# Altium footprint library AltiumLibraries.PcbLib: 247 footprints (part 11 of 16)
Each footprint in its own frame and in the unit in brackets; x right, y up, seen from the top. Pads: shape width x height; smd on the part's side, far side on the other; paste and mask are expansions set on the pad; w line width, h text height; cw(c..) or ccw(c..) is an arc to the next point about the centre after c.
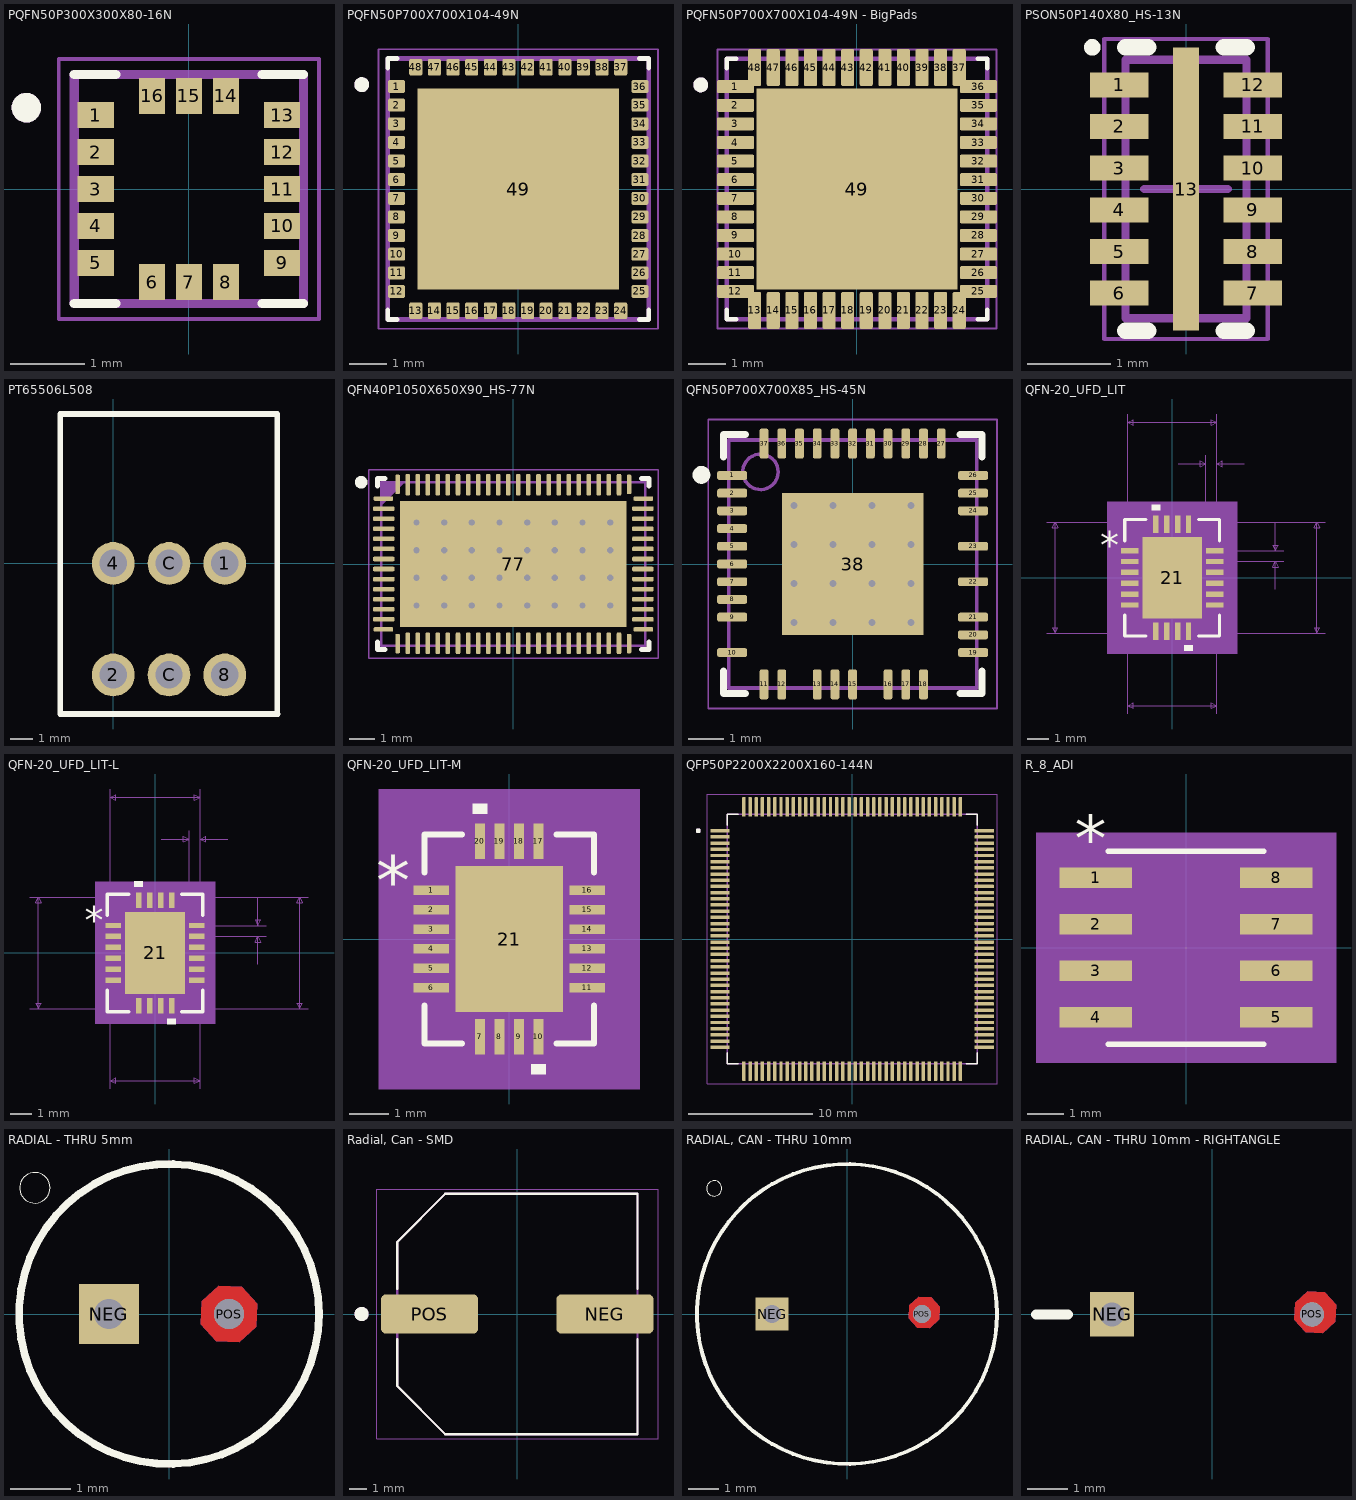
[diagram p10: the footprints below, top view; thin cyan lines are the x and y axes]

## PQFN50P300X300X80-16N [mm]
pads (16):
  rect 0.49x0.35 smd: 1(-1.26,1) 2(-1.26,0.5) 3(-1.26,0) 4(-1.26,-0.5) 5(-1.26,-1) 9(1.26,-1) 10(1.26,-0.5) 11(1.26,0) 12(1.26,0.5) 13(1.26,1)
  rect 0.35x0.49 smd: 6(-0.5,-1.26) 7(0,-1.26) 8(0.5,-1.26) 14(0.5,1.26) 15(0,1.26) 16(-0.5,1.26)
Top Overlay:
  circle w0.2: c-2.2,1.1 r0.1
  lines w0.127: -1.55,-1.55 -0.99,-1.55 ; -1.55,1.55 -0.99,1.55 ; 0.99,-1.55 1.55,-1.55 ; 0.99,1.55 1.55,1.55
Mechanical 13:
  circle w0.2: c-2.2,1.1 r0.1
  lines w0.127: -1.55,-1.55 1.55,-1.55 1.55,1.55 -1.55,1.55 -1.55,-1.55
Mechanical 15:
  lines w0.05: -1.76,-1.76 1.76,-1.76 1.76,1.76 -1.76,1.76 -1.76,-1.76
3D body "step_temp.STEP": height 0.8, standoff 0, extent -1.5,-1.5 1.5,1.5

## PQFN50P700X700X104-49N [mm]
pads (49):
  rrect25% 0.45x0.35 smd: 1(-3.265,2.75) 2(-3.265,2.25) 3(-3.265,1.75) 4(-3.265,1.25) 5(-3.265,0.75) 6(-3.265,0.25) 7(-3.265,-0.25) 8(-3.265,-0.75) 9(-3.265,-1.25) 10(-3.265,-1.75) 11(-3.265,-2.25) 12(-3.265,-2.75) 25(3.265,-2.75) 26(3.265,-2.25) 27(3.265,-1.75) 28(3.265,-1.25) 29(3.265,-0.75) 30(3.265,-0.25) 31(3.265,0.25) 32(3.265,0.75) 33(3.265,1.25) 34(3.265,1.75) 35(3.265,2.25) 36(3.265,2.75)
  rrect25% 0.35x0.45 smd: 13(-2.75,-3.265) 14(-2.25,-3.265) 15(-1.75,-3.265) 16(-1.25,-3.265) 17(-0.75,-3.265) 18(-0.25,-3.265) 19(0.25,-3.265) 20(0.75,-3.265) 21(1.25,-3.265) 22(1.75,-3.265) 23(2.25,-3.265) 24(2.75,-3.265) 37(2.75,3.265) 38(2.25,3.265) 39(1.75,3.265) 40(1.25,3.265) 41(0.75,3.265) 42(0.25,3.265) 43(-0.25,3.265) 44(-0.75,3.265) 45(-1.25,3.265) 46(-1.75,3.265) 47(-2.25,3.265) 48(-2.75,3.265)
  rect 5.4x5.4 smd paste-4: 49(0,0)
Top Overlay:
  circle w0.2: c-4.2,2.8 r0.1
  lines w0.127: -3.5,-3.245 -3.5,-3.5 -3.245,-3.5 ; -3.5,3.245 -3.5,3.5 -3.245,3.5 ; 3.245,-3.5 3.5,-3.5 3.5,-3.245 ; 3.245,3.5 3.5,3.5 3.5,3.245
Top Paste:
  region: 2.305,-2.305 0.395,-2.305 0.395,-0.395 2.305,-0.395
  region: -0.395,-2.305 -2.305,-2.305 -2.305,-0.395 -0.395,-0.395
  region: -0.395,0.395 -2.305,0.395 -2.305,2.305 -0.395,2.305
  region: 2.305,0.395 0.395,0.395 0.395,2.305 2.305,2.305
Mechanical 13:
  circle w0.2: c-4.2,2.8 r0.1
  lines w0.127: -3.5,-3.5 3.5,-3.5 3.5,3.5 -3.5,3.5 -3.5,-3.5
Mechanical 15:
  lines w0.05: -3.75,-3.75 -3.75,3.75 3.75,3.75 3.75,-3.75 -3.75,-3.75
3D body "step_temp.STEP": height 1.04, standoff 0, extent -3.5,-3.5 3.5,3.5

## PQFN50P700X700X104-49N - BigPads [mm]
pads (49):
  rrect25% 1x0.35 smd: 1(-3.265,2.75) 2(-3.265,2.25) 3(-3.265,1.75) 4(-3.265,1.25) 5(-3.265,0.75) 6(-3.265,0.25) 7(-3.265,-0.25) 8(-3.265,-0.75) 9(-3.265,-1.25) 10(-3.265,-1.75) 11(-3.265,-2.25) 12(-3.265,-2.75) 25(3.265,-2.75) 26(3.265,-2.25) 27(3.265,-1.75) 28(3.265,-1.25) 29(3.265,-0.75) 30(3.265,-0.25) 31(3.265,0.25) 32(3.265,0.75) 33(3.265,1.25) 34(3.265,1.75) 35(3.265,2.25) 36(3.265,2.75)
  rrect25% 0.35x1 smd: 13(-2.75,-3.265) 14(-2.25,-3.265) 15(-1.75,-3.265) 16(-1.25,-3.265) 17(-0.75,-3.265) 18(-0.25,-3.265) 19(0.25,-3.265) 20(0.75,-3.265) 21(1.25,-3.265) 22(1.75,-3.265) 23(2.25,-3.265) 24(2.75,-3.265) 37(2.75,3.265) 38(2.25,3.265) 39(1.75,3.265) 40(1.25,3.265) 41(0.75,3.265) 42(0.25,3.265) 43(-0.25,3.265) 44(-0.75,3.265) 45(-1.25,3.265) 46(-1.75,3.265) 47(-2.25,3.265) 48(-2.75,3.265)
  rect 5.4x5.4 smd paste-4: 49(0,0)
Top Overlay:
  circle w0.2: c-4.2,2.8 r0.1
  lines w0.127: -3.5,-3.245 -3.5,-3.5 -3.245,-3.5 ; -3.5,3.245 -3.5,3.5 -3.245,3.5 ; 3.245,-3.5 3.5,-3.5 3.5,-3.245 ; 3.245,3.5 3.5,3.5 3.5,3.245
Top Paste:
  region: 2.305,-2.305 0.395,-2.305 0.395,-0.395 2.305,-0.395
  region: -0.395,-2.305 -2.305,-2.305 -2.305,-0.395 -0.395,-0.395
  region: -0.395,0.395 -2.305,0.395 -2.305,2.305 -0.395,2.305
  region: 2.305,0.395 0.395,0.395 0.395,2.305 2.305,2.305
Mechanical 13:
  circle w0.2: c-4.2,2.8 r0.1
  lines w0.127: -3.5,-3.5 3.5,-3.5 3.5,3.5 -3.5,3.5 -3.5,-3.5
Mechanical 15:
  lines w0.05: -3.75,-3.75 -3.75,3.75 3.75,3.75 3.75,-3.75 -3.75,-3.75
3D body "step_temp.STEP": height 1.04, standoff 0, extent -3.5,-3.5 3.5,3.5

## PSON50P140X80_HS-13N [mm] "PSON, 12-Leads, Body 3.00x1.35mm, Pitch 0.50mm, Thermal Pad 3.05x0.31mm, IPC Medium Density"
height 0.8
pads (13):
  rect 0.7x0.3 smd: 1(-0.8,1.25) 2(-0.8,0.75) 3(-0.8,0.25) 4(-0.8,-0.25) 5(-0.8,-0.75) 6(-0.8,-1.25) 7(0.8,-1.25) 8(0.8,-0.75) 9(0.8,-0.25) 10(0.8,0.25) 11(0.8,0.75) 12(0.8,1.25)
  rect 0.31x3.4 smd: 13(0,0)
Top Overlay:
  circle w0.1: c-1.125,1.7 r0.05
  lines w0.2: -0.725,-1.7 -0.455,-1.7 ; -0.725,1.7 -0.455,1.7 ; 0.455,-1.7 0.725,-1.7 ; 0.455,1.7 0.725,1.7
Mechanical 13:
  lines w0.1: -0.725,-1.55 -0.725,1.55 0.725,1.55 0.725,-1.55 -0.725,-1.55
Mechanical 15:
  lines w0.05: -0.98,-1.8 -0.98,1.8 0.98,1.8 0.98,-1.8 -0.98,-1.8
  lines w0.1: -0.5,0 0.5,0 ; 0,-0.5 0,0.5
3D body: height 0.8, standoff 0, extent -0.725,-1.55 0.725,1.55

## PT65506L508 [mm] "Rotary Dip Switch Hexadecimal Complement 16 Position Through Hole, Right Angle Rotary with Knob Actuator 150mA 24VDC"
pads (6):
  round 1.95 hole 1.25: 1(5.08,0) 2(0,-5.08) 4(0,0) 8(5.08,-5.08) C(2.54,-5.08) C(2.54,0)
Top Overlay:
  lines w0.254: -2.413,-6.858 -2.413,6.807 7.468,6.807 7.468,-6.833 7.493,-6.858 -1.651,-6.858 -2.413,-6.858
3D body "PT65101L508--3DModel-STEP-56544.STEP": height 10, standoff -4, extent -2.482,-5.217 7.518,6.883

## QFN40P1050X650X90_HS-77N [mm] "QFN, 76-Leads, Body 10,50x6,50mm, Pitch 0,40mm, Thermal Pad 9,00x5,00mm, IPC Medium Density"
height 0.9
pads (77):
  rrect50% 0.768x0.182 smd mask+0.051: 1(-5.166,2.6) 14(-5.166,-2.6) 39(5.166,-2.6) 52(5.166,2.6)
  rrect50% 0.85x0.182 smd mask+0.051: 2(-5.15,2.2) 3(-5.15,1.8) 4(-5.15,1.4) 5(-5.15,1) 6(-5.15,0.6) 7(-5.15,0.2) 8(-5.15,-0.2) 9(-5.15,-0.6) 10(-5.15,-1) 11(-5.15,-1.4) 12(-5.15,-1.8) 13(-5.15,-2.2) 40(5.15,-2.2) 41(5.15,-1.8) 42(5.15,-1.4) 43(5.15,-1) 44(5.15,-0.6) 45(5.15,-0.2) 46(5.15,0.2) 47(5.15,0.6) 48(5.15,1) 49(5.15,1.4) 50(5.15,1.8) 51(5.15,2.2)
  rrect50% 0.182x0.768 smd mask+0.051: 15(-4.6,-3.166) 38(4.6,-3.166) 53(4.6,3.166) 76(-4.6,3.166)
  rrect50% 0.182x0.85 smd mask+0.051: 16(-4.2,-3.15) 17(-3.8,-3.15) 18(-3.4,-3.15) 19(-3,-3.15) 20(-2.6,-3.15) 21(-2.2,-3.15) 22(-1.8,-3.15) 23(-1.4,-3.15) 24(-1,-3.15) 25(-0.6,-3.15) 26(-0.2,-3.15) 27(0.2,-3.15) 28(0.6,-3.15) 29(1,-3.15) 30(1.4,-3.15) 31(1.8,-3.15) 32(2.2,-3.15) 33(2.6,-3.15) 34(3,-3.15) 35(3.4,-3.15) 36(3.8,-3.15) 37(4.2,-3.15) 54(4.2,3.15) 55(3.8,3.15) 56(3.4,3.15) 57(3,3.15) 58(2.6,3.15) 59(2.2,3.15) 60(1.8,3.15) 61(1.4,3.15) 62(1,3.15) 63(0.6,3.15) 64(0.2,3.15) 65(-0.2,3.15) 66(-0.6,3.15) 67(-1,3.15) 68(-1.4,3.15) 69(-1.8,3.15) 70(-2.2,3.15) 71(-2.6,3.15) 72(-3,3.15) 73(-3.4,3.15) 74(-3.8,3.15) 75(-4.2,3.15)
  rect 9x5 smd paste-99 mask+0.051: 77(0,0)
via 3.85,-1.65 diameter 0.61 hole 0.254
via 2.75,-1.65 diameter 0.61 hole 0.254
via 1.65,-1.65 diameter 0.61 hole 0.254
via 0.55,-1.65 diameter 0.61 hole 0.254
via -0.55,-1.65 diameter 0.61 hole 0.254
via -1.65,-1.65 diameter 0.61 hole 0.254
via -2.75,-1.65 diameter 0.61 hole 0.254
via -3.85,-1.65 diameter 0.61 hole 0.254
via 3.85,-0.55 diameter 0.61 hole 0.254
via 2.75,-0.55 diameter 0.61 hole 0.254
via 1.65,-0.55 diameter 0.61 hole 0.254
via 0.55,-0.55 diameter 0.61 hole 0.254
via -0.55,-0.55 diameter 0.61 hole 0.254
via -1.65,-0.55 diameter 0.61 hole 0.254
via -2.75,-0.55 diameter 0.61 hole 0.254
via -3.85,-0.55 diameter 0.61 hole 0.254
via 3.85,0.55 diameter 0.61 hole 0.254
via 2.75,0.55 diameter 0.61 hole 0.254
via 1.65,0.55 diameter 0.61 hole 0.254
via 0.55,0.55 diameter 0.61 hole 0.254
via -0.55,0.55 diameter 0.61 hole 0.254
via -1.65,0.55 diameter 0.61 hole 0.254
via -2.75,0.55 diameter 0.61 hole 0.254
via -3.85,0.55 diameter 0.61 hole 0.254
via 3.85,1.65 diameter 0.61 hole 0.254
via 2.75,1.65 diameter 0.61 hole 0.254
via 1.65,1.65 diameter 0.61 hole 0.254
via 0.55,1.65 diameter 0.61 hole 0.254
via -0.55,1.65 diameter 0.61 hole 0.254
via -1.65,1.65 diameter 0.61 hole 0.254
via -2.75,1.65 diameter 0.61 hole 0.254
via -3.85,1.65 diameter 0.61 hole 0.254
Top Overlay:
  circle w0.25: c-6.05,3.25 r0.125
  lines w0.2: -5.4,-3.1 -5.4,-3.4 -5.1,-3.4 ; -5.4,3.1 -5.4,3.4 -5.1,3.4 ; 5.1,-3.4 5.4,-3.4 5.4,-3.1 ; 5.1,3.4 5.4,3.4 5.4,3.1
Top Paste:
  circle w0.35: c-2.75,-0.55 r0.55
  circle w0.35: c-2.75,0.55 r0.55
  circle w0.35: c-2.75,1.65 r0.55
  circle w0.35: c-1.65,1.65 r0.55
  circle w0.35: c-1.65,0.55 r0.55
  circle w0.35: c-0.55,0.55 r0.55
  circle w0.35: c-1.65,-0.55 r0.55
  circle w0.35: c-0.55,-0.55 r0.55
  circle w0.35: c-2.75,-1.65 r0.55
  circle w0.35: c-1.65,-1.65 r0.55
  circle w0.35: c-0.55,-1.65 r0.55
  circle w0.35: c0.55,-1.65 r0.55
  circle w0.35: c1.65,0.55 r0.55
  circle w0.35: c0.55,0.55 r0.55
  circle w0.35: c0.55,-0.55 r0.55
  circle w0.35: c1.65,-0.55 r0.55
  circle w0.35: c1.65,-1.65 r0.55
  circle w0.35: c2.75,-1.65 r0.55
  circle w0.35: c2.75,-0.55 r0.55
  circle w0.35: c2.75,0.55 r0.55
  circle w0.35: c2.75,1.65 r0.55
  circle w0.35: c1.65,1.65 r0.55
  circle w0.35: c0.55,1.65 r0.55
  circle w0.35: c-0.55,1.65 r0.55
  rectangle: 4.282,-2.5 4.5,2.5
  region: -4.282,2.5 -4.5,2.5 -4.5,-2.5 -4.282,-2.5
  region: 4.5,-2.102 -4.5,-2.102 -4.5,-2.5 4.5,-2.5
  region: 4.5,2.102 -4.5,2.102 -4.5,2.5 4.5,2.5
  region: 4.5,-1.002 -4.5,-1.002 -4.5,-1.203 4.5,-1.203
  region: 4.5,0.098 -4.5,0.098 -4.5,-0.103 4.5,-0.103
  region: 4.5,1.198 -4.5,1.198 -4.5,0.997 4.5,0.997
  lines w0.254: -4.286,-1.395 ccw(c-3.85,-1.65) -4.282,-1.912 ; -4.286,-0.295 ccw(c-3.85,-0.55) -4.282,-0.812 ; -4.286,0.805 ccw(c-3.85,0.55) -4.282,0.288 ; -4.286,1.905 ccw(c-3.85,1.65) -4.282,1.388 ; 4.282,-1.388 cw(c3.85,-1.65) 4.286,-1.905 ; 4.282,-0.288 cw(c3.85,-0.55) 4.286,-0.805 ; 4.282,0.812 cw(c3.85,0.55) 4.286,0.295 ; 4.282,1.912 cw(c3.85,1.65) 4.286,1.395
  lines w0.35: -4.325,-1.372 cw(c-3.85,-1.65) -4.32,-1.935 ; -4.325,-0.272 cw(c-3.85,-0.55) -4.32,-0.835 ; -4.325,0.828 cw(c-3.85,0.55) -4.32,0.265 ; -4.325,1.928 cw(c-3.85,1.65) -4.32,1.365 ; 4.32,-1.365 ccw(c3.85,-1.65) 4.325,-1.928 ; 4.32,-0.265 ccw(c3.85,-0.55) 4.325,-0.828 ; 4.32,0.835 ccw(c3.85,0.55) 4.325,0.272 ; 4.32,1.935 ccw(c3.85,1.65) 4.325,1.372
Mechanical 15:
  lines w0.05: -5.75,-3.75 5.75,-3.75 5.75,3.75 -5.75,3.75 -5.75,-3.75
Mechanical 29:
  region: -5.25,3.25 -5.25,2.318 -4.318,3.25
  lines w0.1: -5.25,-3.25 -5.25,3.25 5.25,3.25 5.25,-3.25 -5.25,-3.25
3D body "QFN40P1050X650X90_HS-77N.step": height 0.9, standoff 0, extent -4.927,-3.251 5.575,3.251

## QFN50P700X700X85_HS-45N [mm] "QFN, 44-Leads, Body 7.00x7.00mm, Pitch 0.50mm, Thermal Pad 4.00x4.00mm, IPC Medium Density"
height 0.85
pads (38):
  rrect50% 0.85x0.25 smd mask+0.075: 1(-3.4,2.5) 2(-3.4,2) 3(-3.4,1.5) 4(-3.4,1) 5(-3.4,0.5) 6(-3.4,0) 7(-3.4,-0.5) 8(-3.4,-1) 9(-3.4,-1.5) 10(-3.4,-2.5) 19(3.4,-2.5) 20(3.4,-2) 21(3.4,-1.5) 22(3.4,-0.5) 23(3.4,0.5) 24(3.4,1.5) 25(3.4,2) 26(3.4,2.5)
  rrect50% 0.25x0.85 smd mask+0.075: 11(-2.5,-3.4) 12(-2,-3.4) 13(-1,-3.4) 14(-0.5,-3.4) 15(0,-3.4) 16(1,-3.4) 17(1.5,-3.4) 18(2,-3.4) 27(2.5,3.4) 28(2,3.4) 29(1.5,3.4) 30(1,3.4) 31(0.5,3.4) 32(0,3.4) 33(-0.5,3.4) 34(-1,3.4) 35(-1.5,3.4) 36(-2,3.4) 37(-2.5,3.4)
  rect 4x4 smd paste-99: 38(0,0)
via -0.55,1.65 diameter 0.5 hole 0.2
via 0.55,1.65 diameter 0.5 hole 0.2
via -1.65,0.55 diameter 0.5 hole 0.2
via -0.55,0.55 diameter 0.5 hole 0.2
via 0.55,0.55 diameter 0.5 hole 0.2
via 1.65,0.55 diameter 0.5 hole 0.2
via -1.65,-0.55 diameter 0.5 hole 0.2
via -0.55,-0.55 diameter 0.5 hole 0.2
via 0.55,-0.55 diameter 0.5 hole 0.2
via 1.65,-0.55 diameter 0.5 hole 0.2
via -0.55,-1.65 diameter 0.5 hole 0.2
via 0.55,-1.65 diameter 0.5 hole 0.2
via 1.65,1.65 diameter 0.5 hole 0.2
via -1.65,1.65 diameter 0.5 hole 0.2
via 1.65,-1.65 diameter 0.5 hole 0.2
via -1.65,-1.65 diameter 0.5 hole 0.2
Top Overlay:
  circle w0.25: c-4.267,2.515 r0.125
  lines w0.2: -3.65,-3.025 -3.65,-3.65 -3.025,-3.65 ; -3.65,3.025 -3.65,3.65 -3.025,3.65 ; 3.025,-3.65 3.65,-3.65 3.65,-3.025 ; 3.025,3.65 3.65,3.65 3.65,3.025
Top Paste:
  drawing of 108 lines, arcs and shapes, not listed
Mechanical 13:
  circle w0.1: c-2.6,2.6 r0.5
  lines w0.1: -3.5,-3.5 -3.5,3.5 3.5,3.5 3.5,-3.5 -3.5,-3.5
Mechanical 15:
  lines w0.05: -4.075,-4.075 -4.075,4.075 4.075,4.075 4.075,-4.075 -4.075,-4.075
  lines w0.1: -0.5,0 0.5,0 ; 0,-0.5 0,0.5
3D body "QFN50P700X700X85_HS-45N.step": height 0.85, standoff 0, extent -3.535,-3.535 3.535,3.535

## QFN-20_UFD_LIT [mm]
pads (21):
  rect 0.805x0.249 smd paste+0 mask+0: 1(-1.952,1.25) 2(-1.952,0.75) 3(-1.952,0.25) 4(-1.952,-0.25) 5(-1.952,-0.75) 6(-1.952,-1.25) 11(1.952,-1.25) 12(1.952,-0.75) 13(1.952,-0.25) 14(1.952,0.25) 15(1.952,0.75) 16(1.952,1.25)
  rect 0.249x0.805 smd paste+0 mask+0: 7(-0.75,-2.452) 8(-0.25,-2.452) 9(0.25,-2.452) 10(0.75,-2.452) 17(0.75,2.452) 18(0.25,2.452) 19(-0.25,2.452) 20(-0.75,2.452)
  rect 2.75x3.75 smd paste-1.862 mask+0: 21(0,0)
Top Overlay:
  region: -0.56,3.109 -0.941,3.109 -0.941,3.363 -0.56,3.363
  region: 0.941,-3.109 0.56,-3.109 0.56,-3.363 0.941,-3.363
  lines w0.152: -2.177,-1.707 -2.177,-2.677 -1.207,-2.677 ; -2.177,1.707 -2.177,2.677 -1.207,2.677 ; 1.207,-2.677 2.177,-2.677 2.177,-1.707 ; 1.207,2.677 2.177,2.677 2.177,1.707
  text "*" at -3.307,0.865 h1.27
Top Paste:
  region: 1.275,-0.1 0.1,-0.1 0.1,-1.775 1.275,-1.775
  region: 1.275,1.775 0.1,1.775 0.1,0.1 1.275,0.1
  region: -0.1,-0.1 -1.275,-0.1 -1.275,-1.775 -0.1,-1.775
  region: -0.1,1.775 -1.275,1.775 -1.275,0.1 -0.1,0.1
Mechanical 5:
  region: 2.99,-3.49 -2.99,-3.49 -2.99,3.49 2.99,3.49
Mechanical 7:
  lines w0.025: -5.758,-2.55 2.05,-2.55 ; -5.758,2.55 2.05,2.55 2.05,-6.258 ; -2.05,-6.258 -2.05,2.55 ; -2.05,1.25 -2.05,7.528 ; 0.28,5.242 1.55,5.242 ; 0.75,-2.55 7.028,-2.55 ; 0.75,2.55 7.028,2.55 ; 1.55,1.25 1.55,5.623 ; 1.952,0.75 5.123,0.75 ; 1.952,1.25 5.123,1.25 ; 2.05,5.623 2.05,1.25 2.05,7.528 ; 3.32,5.242 2.05,5.242 ; 4.742,-0.52 4.742,0.75 ; 4.742,2.52 4.742,1.25 ; -5.377,-2.55 -5.25,-2.296 -5.504,-2.296 -5.377,-2.55 ; -5.377,-2.55 -5.377,2.55 ; -5.377,2.55 -5.25,2.296 -5.504,2.296 -5.377,2.55 ; -2.05,-5.877 -1.796,-6.004 -1.796,-5.75 -2.05,-5.877 ; -2.05,-5.877 2.05,-5.877 ; -2.05,7.147 -1.796,7.02 -1.796,7.274 -2.05,7.147 ; -2.05,7.147 2.05,7.147 ; 1.55,5.242 1.296,5.115 1.296,5.369 1.55,5.242 ; 2.05,-5.877 1.796,-6.004 1.796,-5.75 2.05,-5.877 ; 2.05,5.242 2.304,5.115 2.304,5.369 2.05,5.242 ; 2.05,7.147 1.796,7.02 1.796,7.274 2.05,7.147 ; 4.742,0.75 4.869,0.496 4.615,0.496 4.742,0.75 ; 4.742,1.25 4.869,1.504 4.615,1.504 4.742,1.25 ; 6.647,-2.55 6.774,-2.296 6.52,-2.296 6.647,-2.55 ; 6.647,-2.55 6.647,2.55 ; 6.647,2.55 6.774,2.296 6.52,2.296 6.647,2.55
  text "0.161in/4.1mm" at -2.064,-7.02 h0.64
  text "0.201in/5.1mm" at -10.013,-0.318 h0.64
  text "0.201in/5.1mm" at 7.155,-0.318 h0.64
  text "0.161in/4.1mm" at -2.064,7.655 h0.64
  text "0.02in/0.5mm" at -0.105,5.75 h0.64
  text "0.02in/0.5mm" at 5.25,0.683 h0.64
  text "Alt 2 Padstyle: OX90Y60D30P" at -8.572,-16.825 h1.27
  text "Alt 1 Padstyle: OX60Y90D30P" at -8.572,-15.301 h1.27
  text "Heat Tab Padstyle: RX108p27Y147p64D0T" at -11.747,-12.253 h1.27
  text "Default Padstyle: RX9p81Y31p69D0T" at -10.477,-10.729 h1.27
Mechanical 13:
  lines w0.025: -2.05,1.28 -0.78,2.55 ; -2.05,-2.55 -2.05,2.55 2.05,2.55 2.05,-2.55 -2.05,-2.55 ; -2.05,-1.4 -2.05,-1.1 -2.05,-1.4 ; -2.05,-0.9 -2.05,-0.6 -2.05,-0.9 ; -2.05,-0.4 -2.05,-0.1 -2.05,-0.4 ; -2.05,0.1 -2.05,0.4 -2.05,0.1 ; -2.05,0.6 -2.05,0.9 -2.05,0.6 ; -2.05,1.1 -2.05,1.4 -2.05,1.1 ; -0.9,-2.55 -0.6,-2.55 -0.9,-2.55 ; -0.9,2.55 -0.6,2.55 -0.9,2.55 ; -0.4,-2.55 -0.1,-2.55 -0.4,-2.55 ; -0.4,2.55 -0.1,2.55 -0.4,2.55 ; 0.1,-2.55 0.4,-2.55 0.1,-2.55 ; 0.1,2.55 0.4,2.55 0.1,2.55 ; 0.6,-2.55 0.9,-2.55 0.6,-2.55 ; 0.6,2.55 0.9,2.55 0.6,2.55 ; 2.05,-1.4 2.05,-1.1 2.05,-1.4 ; 2.05,-0.9 2.05,-0.6 2.05,-0.9 ; 2.05,-0.4 2.05,-0.1 2.05,-0.4 ; 2.05,0.1 2.05,0.4 2.05,0.1 ; 2.05,0.6 2.05,0.9 2.05,0.6 ; 2.05,1.1 2.05,1.4 2.05,1.1
  text "*" at -1.867,0.865 h1.27
Mechanical 15:
  region: -1.129,-2.804 -2.304,-2.804 -2.304,-1.629 -2.609,-1.629 -2.609,1.629 -2.304,1.629 -2.304,2.804 -1.129,2.804 -1.129,3.109 1.129,3.109 1.129,2.804 2.304,2.804 2.304,1.629 2.609,1.629 2.609,-1.629 2.304,-1.629 2.304,-2.804 1.129,-2.804 1.129,-3.109 -1.129,-3.109
  lines w0.152: -2.609,-1.629 -2.609,1.629 -2.304,1.629 -2.304,2.804 -1.129,2.804 -1.129,3.109 1.129,3.109 1.129,2.804 2.304,2.804 2.304,1.629 2.609,1.629 2.609,-1.629 2.304,-1.629 2.304,-2.804 1.129,-2.804 1.129,-3.109 -1.129,-3.109 -1.129,-2.804 -2.304,-2.804 -2.304,-1.629 -2.609,-1.629
3D body: height 0.25, standoff 0, extent 0,0 0.254,0.254

## QFN-20_UFD_LIT-L [mm]
pads (21):
  rect 0.703x0.249 smd paste+0 mask+0: 1(-1.902,1.25) 2(-1.902,0.75) 3(-1.902,0.25) 4(-1.902,-0.25) 5(-1.902,-0.75) 6(-1.902,-1.25) 11(1.902,-1.25) 12(1.902,-0.75) 13(1.902,-0.25) 14(1.902,0.25) 15(1.902,0.75) 16(1.902,1.25)
  rect 0.249x0.703 smd paste+0 mask+0: 7(-0.75,-2.402) 8(-0.25,-2.402) 9(0.25,-2.402) 10(0.75,-2.402) 17(0.75,2.402) 18(0.25,2.402) 19(-0.25,2.402) 20(-0.75,2.402)
  rect 2.75x3.75 smd paste-1.862 mask+0: 21(0,0)
Top Overlay:
  region: 0.941,-3.007 0.56,-3.007 0.56,-3.261 0.941,-3.261
  region: -0.56,3.007 -0.941,3.007 -0.941,3.261 -0.56,3.261
  lines w0.152: -2.177,-1.707 -2.177,-2.677 -1.207,-2.677 ; -2.177,1.707 -2.177,2.677 -1.207,2.677 ; 1.207,-2.677 2.177,-2.677 2.177,-1.707 ; 1.207,2.677 2.177,2.677 2.177,1.707
  text "*" at -3.206,0.865 h1.27
Top Paste:
  region: -0.1,1.775 -1.275,1.775 -1.275,0.1 -0.1,0.1
  region: -0.1,-0.1 -1.275,-0.1 -1.275,-1.775 -0.1,-1.775
  region: 1.275,1.775 0.1,1.775 0.1,0.1 1.275,0.1
  region: 1.275,-0.1 0.1,-0.1 0.1,-1.775 1.275,-1.775
Mechanical 5:
  region: 2.736,-3.236 -2.736,-3.236 -2.736,3.236 2.736,3.236
Mechanical 7:
  lines w0.025: -5.708,-2.55 2.05,-2.55 ; -5.708,2.55 2.05,2.55 2.05,-6.208 ; -2.05,-6.208 -2.05,2.55 ; -2.05,1.25 -2.05,7.478 ; 0.28,5.192 1.55,5.192 ; 0.75,-2.55 6.978,-2.55 ; 0.75,2.55 6.978,2.55 ; 1.55,1.25 1.55,5.573 ; 1.902,0.75 5.073,0.75 ; 1.902,1.25 5.073,1.25 ; 2.05,5.573 2.05,1.25 2.05,7.478 ; 3.32,5.192 2.05,5.192 ; 4.692,-0.52 4.692,0.75 ; 4.692,2.52 4.692,1.25 ; -5.327,-2.55 -5.327,2.55 ; -5.327,-2.55 -5.454,-2.296 -5.2,-2.296 -5.327,-2.55 ; -5.327,2.55 -5.454,2.296 -5.2,2.296 -5.327,2.55 ; -2.05,-5.827 2.05,-5.827 ; -2.05,-5.827 -1.796,-5.7 -1.796,-5.954 -2.05,-5.827 ; -2.05,7.097 2.05,7.097 ; -2.05,7.097 -1.796,7.224 -1.796,6.97 -2.05,7.097 ; 1.55,5.192 1.296,5.319 1.296,5.065 1.55,5.192 ; 2.05,-5.827 1.796,-5.7 1.796,-5.954 2.05,-5.827 ; 2.05,5.192 2.304,5.319 2.304,5.065 2.05,5.192 ; 2.05,7.097 1.796,7.224 1.796,6.97 2.05,7.097 ; 4.692,0.75 4.565,0.496 4.819,0.496 4.692,0.75 ; 4.692,1.25 4.565,1.504 4.819,1.504 4.692,1.25 ; 6.597,-2.55 6.597,2.55 ; 6.597,-2.55 6.47,-2.296 6.724,-2.296 6.597,-2.55 ; 6.597,2.55 6.47,2.296 6.724,2.296 6.597,2.55
  text "Default Padstyle: RX9p81Y27p69D0T" at -10.477,-10.627 h1.27
  text "Heat Tab Padstyle: RX108p27Y147p64D0T" at -11.747,-12.151 h1.27
  text "Alt 1 Padstyle: OX60Y90D30P" at -8.572,-15.199 h1.27
  text "Alt 2 Padstyle: OX90Y60D30P" at -8.572,-16.723 h1.27
  text "0.02in/0.5mm" at 5.2,0.683 h0.64
  text "0.02in/0.5mm" at -0.105,5.7 h0.64
  text "0.161in/4.1mm" at -2.064,7.605 h0.64
  text "0.201in/5.1mm" at 7.105,-0.318 h0.64
  text "0.201in/5.1mm" at -9.962,-0.318 h0.64
  text "0.161in/4.1mm" at -2.064,-6.97 h0.64
Mechanical 13:
  lines w0.025: -2.05,1.28 -0.78,2.55 ; -2.05,-2.55 2.05,-2.55 2.05,2.55 -2.05,2.55 -2.05,-2.55 ; -2.05,-1.4 -2.05,-1.1 -2.05,-1.4 ; -2.05,-0.9 -2.05,-0.6 -2.05,-0.9 ; -2.05,-0.4 -2.05,-0.1 -2.05,-0.4 ; -2.05,0.1 -2.05,0.4 -2.05,0.1 ; -2.05,0.6 -2.05,0.9 -2.05,0.6 ; -2.05,1.1 -2.05,1.4 -2.05,1.1 ; -0.9,-2.55 -0.6,-2.55 -0.9,-2.55 ; -0.9,2.55 -0.6,2.55 -0.9,2.55 ; -0.4,-2.55 -0.1,-2.55 -0.4,-2.55 ; -0.4,2.55 -0.1,2.55 -0.4,2.55 ; 0.1,-2.55 0.4,-2.55 0.1,-2.55 ; 0.1,2.55 0.4,2.55 0.1,2.55 ; 0.6,-2.55 0.9,-2.55 0.6,-2.55 ; 0.6,2.55 0.9,2.55 0.6,2.55 ; 2.05,-1.4 2.05,-1.1 2.05,-1.4 ; 2.05,-0.9 2.05,-0.6 2.05,-0.9 ; 2.05,-0.4 2.05,-0.1 2.05,-0.4 ; 2.05,0.1 2.05,0.4 2.05,0.1 ; 2.05,0.6 2.05,0.9 2.05,0.6 ; 2.05,1.1 2.05,1.4 2.05,1.1
  text "*" at -1.867,0.865 h1.27
Mechanical 15:
  region: -0.976,-2.652 -2.152,-2.652 -2.152,-1.476 -2.355,-1.476 -2.355,1.476 -2.152,1.476 -2.152,2.652 -0.976,2.652 -0.976,2.855 0.976,2.855 0.976,2.652 2.152,2.652 2.152,1.476 2.355,1.476 2.355,-1.476 2.152,-1.476 2.152,-2.652 0.976,-2.652 0.976,-2.855 -0.976,-2.855
  lines w0.152: -2.355,-1.476 -2.152,-1.476 -2.152,-2.652 -0.976,-2.652 -0.976,-2.855 0.976,-2.855 0.976,-2.652 2.152,-2.652 2.152,-1.476 2.355,-1.476 2.355,1.476 2.152,1.476 2.152,2.652 0.976,2.652 0.976,2.855 -0.976,2.855 -0.976,2.652 -2.152,2.652 -2.152,1.476 -2.355,1.476 -2.355,-1.476
3D body: height 0.25, standoff 0, extent 0,0 0.254,0.254

## QFN-20_UFD_LIT-M [mm]
pads (21):
  rect 0.906x0.249 smd paste+0 mask+0: 1(-2.003,1.25) 2(-2.003,0.75) 3(-2.003,0.25) 4(-2.003,-0.25) 5(-2.003,-0.75) 6(-2.003,-1.25) 11(2.003,-1.25) 12(2.003,-0.75) 13(2.003,-0.25) 14(2.003,0.25) 15(2.003,0.75) 16(2.003,1.25)
  rect 0.249x0.906 smd paste+0 mask+0: 7(-0.75,-2.503) 8(-0.25,-2.503) 9(0.25,-2.503) 10(0.75,-2.503) 17(0.75,2.503) 18(0.25,2.503) 19(-0.25,2.503) 20(-0.75,2.503)
  rect 2.75x3.75 smd paste-1.862 mask+0: 21(0,0)
Top Overlay:
  region: 0.941,-3.21 0.56,-3.21 0.56,-3.464 0.941,-3.464
  region: -0.56,3.21 -0.941,3.21 -0.941,3.464 -0.56,3.464
  lines w0.152: -2.177,-1.707 -2.177,-2.677 -1.207,-2.677 ; -2.177,1.707 -2.177,2.677 -1.207,2.677 ; 1.207,-2.677 2.177,-2.677 2.177,-1.707 ; 1.207,2.677 2.177,2.677 2.177,1.707
  text "*" at -3.409,0.865 h1.27
Top Paste:
  region: -0.1,1.775 -1.275,1.775 -1.275,0.1 -0.1,0.1
  region: -0.1,-0.1 -1.275,-0.1 -1.275,-1.775 -0.1,-1.775
  region: 1.275,1.775 0.1,1.775 0.1,0.1 1.275,0.1
  region: 1.275,-0.1 0.1,-0.1 0.1,-1.775 1.275,-1.775
Mechanical 5:
  region: 3.345,-3.845 -3.345,-3.845 -3.345,3.845 3.345,3.845
Mechanical 13:
  lines w0.025: -2.05,1.28 -0.78,2.55 ; -2.05,-2.55 2.05,-2.55 2.05,2.55 -2.05,2.55 -2.05,-2.55 ; -2.05,-1.4 -2.05,-1.1 -2.05,-1.4 ; -2.05,-0.9 -2.05,-0.6 -2.05,-0.9 ; -2.05,-0.4 -2.05,-0.1 -2.05,-0.4 ; -2.05,0.1 -2.05,0.4 -2.05,0.1 ; -2.05,0.6 -2.05,0.9 -2.05,0.6 ; -2.05,1.1 -2.05,1.4 -2.05,1.1 ; -0.9,-2.55 -0.6,-2.55 -0.9,-2.55 ; -0.9,2.55 -0.6,2.55 -0.9,2.55 ; -0.4,-2.55 -0.1,-2.55 -0.4,-2.55 ; -0.4,2.55 -0.1,2.55 -0.4,2.55 ; 0.1,-2.55 0.4,-2.55 0.1,-2.55 ; 0.1,2.55 0.4,2.55 0.1,2.55 ; 0.6,-2.55 0.9,-2.55 0.6,-2.55 ; 0.6,2.55 0.9,2.55 0.6,2.55 ; 2.05,-1.4 2.05,-1.1 2.05,-1.4 ; 2.05,-0.9 2.05,-0.6 2.05,-0.9 ; 2.05,-0.4 2.05,-0.1 2.05,-0.4 ; 2.05,0.1 2.05,0.4 2.05,0.1 ; 2.05,0.6 2.05,0.9 2.05,0.6 ; 2.05,1.1 2.05,1.4 2.05,1.1
  text "*" at -1.867,0.865 h1.27
Mechanical 15:
  region: -1.383,-3.058 -2.558,-3.058 -2.558,-1.883 -2.964,-1.883 -2.964,1.883 -2.558,1.883 -2.558,3.058 -1.383,3.058 -1.383,3.464 1.383,3.464 1.383,3.058 2.558,3.058 2.558,1.883 2.964,1.883 2.964,-1.883 2.558,-1.883 2.558,-3.058 1.383,-3.058 1.383,-3.464 -1.383,-3.464
  lines w0.152: -2.964,-1.883 -2.558,-1.883 -2.558,-3.058 -1.383,-3.058 -1.383,-3.464 1.383,-3.464 1.383,-3.058 2.558,-3.058 2.558,-1.883 2.964,-1.883 2.964,1.883 2.558,1.883 2.558,3.058 1.383,3.058 1.383,3.464 -1.383,3.464 -1.383,3.058 -2.558,3.058 -2.558,1.883 -2.964,1.883 -2.964,-1.883
3D body: height 0.25, standoff 0, extent 0,0 0.254,0.254
3D body "QFN-20_UFD_LIT.step": height 0.8, standoff 0, extent -2.05,-2.55 2.05,2.55

## QFP50P2200X2200X160-144N [mm] "STM32H743ZiT6"
pads (144):
  rrect25% 1.56x0.28 smd: 1(-10.68,8.75) 2(-10.68,8.25) 3(-10.68,7.75) 4(-10.68,7.25) 5(-10.68,6.75) 6(-10.68,6.25) 7(-10.68,5.75) 8(-10.68,5.25) 9(-10.68,4.75) 10(-10.68,4.25) 11(-10.68,3.75) 12(-10.68,3.25) 13(-10.68,2.75) 14(-10.68,2.25) 15(-10.68,1.75) 16(-10.68,1.25) 17(-10.68,0.75) 18(-10.68,0.25) 19(-10.68,-0.25) 20(-10.68,-0.75) 21(-10.68,-1.25) 22(-10.68,-1.75) 23(-10.68,-2.25) 24(-10.68,-2.75) 25(-10.68,-3.25) 26(-10.68,-3.75) 27(-10.68,-4.25) 28(-10.68,-4.75) 29(-10.68,-5.25) 30(-10.68,-5.75) 31(-10.68,-6.25) 32(-10.68,-6.75) 33(-10.68,-7.25) 34(-10.68,-7.75) 35(-10.68,-8.25) 36(-10.68,-8.75) 73(10.68,-8.75) 74(10.68,-8.25) 75(10.68,-7.75) 76(10.68,-7.25) 77(10.68,-6.75) 78(10.68,-6.25) 79(10.68,-5.75) 80(10.68,-5.25) 81(10.68,-4.75) 82(10.68,-4.25) 83(10.68,-3.75) 84(10.68,-3.25) 85(10.68,-2.75) 86(10.68,-2.25) 87(10.68,-1.75) 88(10.68,-1.25) 89(10.68,-0.75) 90(10.68,-0.25) 91(10.68,0.25) 92(10.68,0.75) 93(10.68,1.25) 94(10.68,1.75) 95(10.68,2.25) 96(10.68,2.75) 97(10.68,3.25) 98(10.68,3.75) 99(10.68,4.25) 100(10.68,4.75) 101(10.68,5.25) 102(10.68,5.75) 103(10.68,6.25) 104(10.68,6.75) 105(10.68,7.25) 106(10.68,7.75) 107(10.68,8.25) 108(10.68,8.75)
  rrect25% 0.28x1.56 smd: 37(-8.75,-10.68) 38(-8.25,-10.68) 39(-7.75,-10.68) 40(-7.25,-10.68) 41(-6.75,-10.68) 42(-6.25,-10.68) 43(-5.75,-10.68) 44(-5.25,-10.68) 45(-4.75,-10.68) 46(-4.25,-10.68) 47(-3.75,-10.68) 48(-3.25,-10.68) 49(-2.75,-10.68) 50(-2.25,-10.68) 51(-1.75,-10.68) 52(-1.25,-10.68) 53(-0.75,-10.68) 54(-0.25,-10.68) 55(0.25,-10.68) 56(0.75,-10.68) 57(1.25,-10.68) 58(1.75,-10.68) 59(2.25,-10.68) 60(2.75,-10.68) 61(3.25,-10.68) 62(3.75,-10.68) 63(4.25,-10.68) 64(4.75,-10.68) 65(5.25,-10.68) 66(5.75,-10.68) 67(6.25,-10.68) 68(6.75,-10.68) 69(7.25,-10.68) 70(7.75,-10.68) 71(8.25,-10.68) 72(8.75,-10.68) 109(8.75,10.68) 110(8.25,10.68) 111(7.75,10.68) 112(7.25,10.68) 113(6.75,10.68) 114(6.25,10.68) 115(5.75,10.68) 116(5.25,10.68) 117(4.75,10.68) 118(4.25,10.68) 119(3.75,10.68) 120(3.25,10.68) 121(2.75,10.68) 122(2.25,10.68) 123(1.75,10.68) 124(1.25,10.68) 125(0.75,10.68) 126(0.25,10.68) 127(-0.25,10.68) 128(-0.75,10.68) 129(-1.25,10.68) 130(-1.75,10.68) 131(-2.25,10.68) 132(-2.75,10.68) 133(-3.25,10.68) 134(-3.75,10.68) 135(-4.25,10.68) 136(-4.75,10.68) 137(-5.25,10.68) 138(-5.75,10.68) 139(-6.25,10.68) 140(-6.75,10.68) 141(-7.25,10.68) 142(-7.75,10.68) 143(-8.25,10.68) 144(-8.75,10.68)
Top Overlay:
  circle w0.2: c-12.44,8.75 r0.1
  lines w0.127: -10.1,-9.21 -10.1,-10.1 -9.21,-10.1 ; -10.1,9.21 -10.1,10.1 -9.21,10.1 ; 9.21,-10.1 10.1,-10.1 10.1,-9.21 ; 9.21,10.1 10.1,10.1 10.1,9.21
Mechanical 13:
  circle w0.2: c-12.44,8.75 r0.1
  lines w0.127: -10.1,-10.1 10.1,-10.1 10.1,10.1 -10.1,10.1 -10.1,-10.1
Mechanical 15:
  lines w0.05: -11.71,-11.71 11.71,-11.71 11.71,11.71 -11.71,11.71 -11.71,-11.71
3D body "STM32H743ZIT6--3DModel-STEP-56544.STEP": height 1.73, standoff 0.13, extent -11,-11 11,11

## R_8_ADI [mil]
pads (8):
  rect 78x22 smd paste+0 mask+0: 1(-97,75) 2(-97,25) 3(-97,-25) 4(-97,-75) 5(97,-75) 6(97,-25) 7(97,25) 8(97,75)
Top Overlay:
  lines w6: -83.5,-103.5 83.5,-103.5 ; -83.5,103.5 83.5,103.5
  text "*" at -119.5,92 h50
Mechanical 5:
  region: 161,-123.5 -161,-123.5 -161,123.5 161,123.5
Mechanical 13:
  lines w0: -12,98.5 ccw(c0,98.5) 12,98.5
  lines w1: -122,-85 -122,-65 -78.5,-65 -78.5,-85 -122,-85 ; -122,-35 -122,-15 -78.5,-15 -78.5,-35 -122,-35 ; -122,15 -122,35 -78.5,35 -78.5,15 -122,15 ; -122,65 -122,85 -78.5,85 -78.5,65 -122,65 ; -78.5,-98.5 78.5,-98.5 78.5,98.5 -78.5,98.5 -78.5,-98.5 ; 78.5,-85 78.5,-65 122,-65 122,-85 78.5,-85 ; 78.5,-35 78.5,-15 122,-15 122,-35 78.5,-35 ; 78.5,15 78.5,35 122,35 122,15 78.5,15 ; 78.5,65 78.5,85 122,85 122,65 78.5,65
  text "*" at -76,45.5 h50
Mechanical 15:
  region: -88.5,-96 -146,-96 -146,96 -88.5,96 -88.5,108.5 88.5,108.5 88.5,96 146,96 146,-96 88.5,-96 88.5,-108.5 -88.5,-108.5
  lines w6: -146,-96 -146,96 -88.5,96 -88.5,108.5 88.5,108.5 88.5,96 146,96 146,-96 88.5,-96 88.5,-108.5 -88.5,-108.5 -88.5,-96 -146,-96
3D body "R_8_ADI.step": height 69.09, standoff 0, extent -122.01,-98.5 122.01,98.5

## RADIAL - THRU 5mm [mm] "Through Hole"
pads (2):
  rect 1.008x1.008 hole 0.5: NEG(-1,0)
  round 0.5 hole 0.5: POS(1,0)
Top Layer:
  region: 1.474,0.172 1.213,0.457 0.828,0.474 0.543,0.213 0.526,-0.172 0.787,-0.457 1.172,-0.474 1.457,-0.213
Bottom Layer:
  region: 1.474,0.172 1.213,0.457 0.828,0.474 0.543,0.213 0.526,-0.172 0.787,-0.457 1.172,-0.474 1.457,-0.213
Top Overlay:
  circle w0: c-2.236,2.103 r0.254
  circle w0.127: c0,0 r2.5
Multi-Layer:
  region: 1.474,0.172 1.213,0.457 0.828,0.474 0.543,0.213 0.526,-0.172 0.787,-0.457 1.172,-0.474 1.457,-0.213

## Radial, Can - SMD [mm]
pads (2):
  rrect25% 5.46x2.21 smd: NEG(4.925,0) POS(-4.925,0)
Top Overlay:
  circle w0.4: c-8.75,0 r0.2
  lines w0.127: -6.75,-1.42 -6.75,-4.05 -4.05,-6.752 6.75,-6.752 6.75,-1.42 ; -6.75,1.42 -6.75,4.05 -4.05,6.752 6.75,6.752 6.75,1.42
Mechanical 13:
  circle w0.4: c-8.75,0 r0.2
  lines w0.127: -6.75,-4.05 -4.05,-6.75 6.75,-6.75 6.75,6.75 -4.05,6.75 -6.75,4.05 -6.75,-4.05
Mechanical 15:
  lines w0.05: -7.905,-7 -7.905,7 7.905,7 7.905,-7 -7.905,-7

## RADIAL, CAN - THRU 10mm [mm]
pads (2):
  rect 1.108x1.108 hole 0.6: NEG(-2.5,0)
  round 0.6 hole 0.6: POS(2.5,0)
Top Layer:
  region: 3.097,0.24 2.81,0.553 2.387,0.571 2.074,0.285 2.056,-0.139 2.342,-0.451 2.766,-0.47 3.078,-0.183
Bottom Layer:
  region: 3.097,0.24 2.81,0.553 2.387,0.571 2.074,0.285 2.056,-0.139 2.342,-0.451 2.766,-0.47 3.078,-0.183
Top Overlay:
  circle w0: c-4.424,4.186 r0.254
  circle w0.127: c0,0 r5
Multi-Layer:
  region: 3.097,0.24 2.81,0.553 2.387,0.571 2.074,0.285 2.056,-0.139 2.342,-0.451 2.766,-0.47 3.078,-0.183

## RADIAL, CAN - THRU 10mm - RIGHTANGLE [mm]
pads (2):
  rect 1.108x1.108 hole 0.6: NEG(-2.5,0)
  round 0.6 hole 0.6: POS(2.5,0)
Top Layer:
  region: 3.097,0.24 2.81,0.553 2.387,0.571 2.074,0.285 2.056,-0.139 2.342,-0.451 2.766,-0.47 3.078,-0.183
Bottom Layer:
  region: 3.097,0.24 2.81,0.553 2.387,0.571 2.074,0.285 2.056,-0.139 2.342,-0.451 2.766,-0.47 3.078,-0.183
Top Overlay:
  lines w0.254: -4.4,0 -3.6,0
Multi-Layer:
  region: 3.097,0.24 2.81,0.553 2.387,0.571 2.074,0.285 2.056,-0.139 2.342,-0.451 2.766,-0.47 3.078,-0.183
3D body: height 11, standoff 1, extent -5,-23.8 5,-1.8